# Altium footprint library pcblib.PcbLib: 92 footprints (part 3 of 6)
Each footprint in its own frame and in the unit in brackets; x right, y up, seen from the top. Pads: shape width x height; smd on the part's side, far side on the other; paste and mask are expansions set on the pad; w line width, h text height; cw(c..) or ccw(c..) is an arc to the next point about the centre after c.
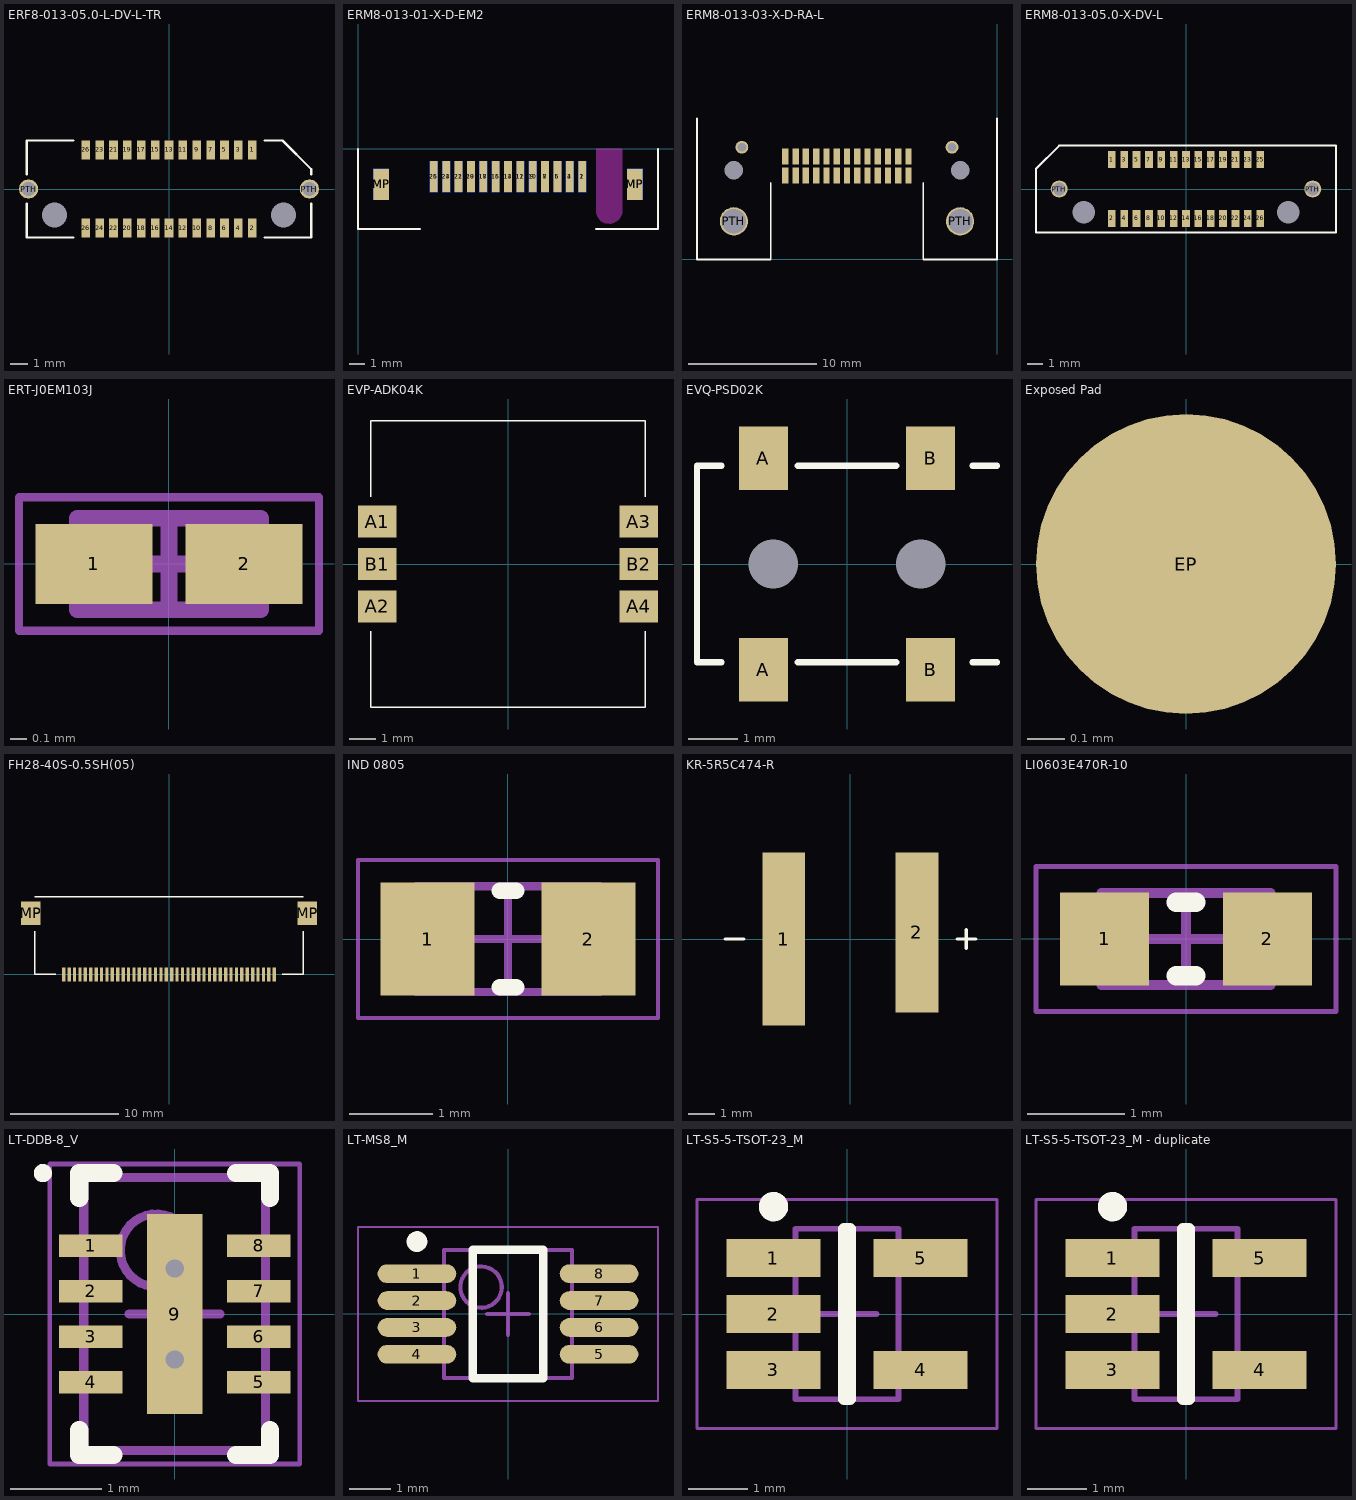
[diagram p2: the footprints below, top view; thin cyan lines are the x and y axes]

## ERF8-013-05.0-L-DV-L-TR [mm] "0,80 mm Edge Rate® Rugged High Speed Socket Strip"
pads (30):
  rect 0.5x1.1 smd: 1(4.8,2.25) 2(4.8,-2.25) 3(4,2.25) 4(4,-2.25) 5(3.2,2.25) 6(3.2,-2.25) 7(2.4,2.25) 8(2.4,-2.25) 9(1.6,2.25) 10(1.6,-2.25) 11(0.8,2.25) 12(0.8,-2.25) 13(0,2.25) 14(0,-2.25) 15(-0.8,2.25) 16(-0.8,-2.25) 17(-1.6,2.25) 18(-1.6,-2.25) 19(-2.4,2.25) 20(-2.4,-2.25) 21(-3.2,2.25) 22(-3.2,-2.25) 23(-4,2.25) 24(-4,-2.25) 26(-4.8,-2.25) 26(-4.8,2.25)
  round 0 hole 1.45 unplated: NPTH(-6.6,-1.5) NPTH(6.6,-1.5)
  round 1.1 hole 0.83: PTH(-8.1,0) PTH(8.1,0)
Top Overlay:
  lines w0.127: -8.2,-0.85 -8.2,-2.8 -5.5,-2.8 ; -8.2,0.85 -8.2,2.8 -5.5,2.8 ; 5.5,-2.8 8.2,-2.8 8.2,-0.85 ; 5.5,2.8 6.547,2.8 8.2,1.147 8.2,0.85
3D body: height 5.35, standoff -1.02, extent -8.2,-2.8 8.2,2.8

## ERM8-013-01-X-D-EM2 [mm] "0,80 mm Edge Rate® Rugged High Speed Terminal Strip, Edge Mount"
pads (30):
  rect 0.5x2 smd: 1(14.5,-1.8) 3(13.7,-1.8) 5(12.9,-1.8) 7(12.1,-1.8) 9(11.3,-1.8) 11(10.5,-1.8) 13(9.7,-1.8) 15(8.9,-1.8) 17(8.1,-1.8) 19(7.3,-1.8) 21(6.5,-1.8) 23(5.7,-1.8) 25(4.9,-1.8)
  rect 0.5x2 smd far side: 2(14.5,-1.8) 4(13.7,-1.8) 6(12.9,-1.8) 8(12.1,-1.8) 10(11.3,-1.8) 12(10.5,-1.8) 14(9.7,-1.8) 16(8.9,-1.8) 18(8.1,-1.8) 20(7.3,-1.8) 22(6.5,-1.8) 24(5.7,-1.8) 26(4.9,-1.8)
  rect 1x2 smd: MP(1.5,-2.3) MP(17.9,-2.3)
  rect 1x2 smd far side: MP(1.5,-2.3) MP(17.9,-2.3)
Top Overlay:
  lines w0.127: 0,0 0,-5.2 4,-5.2 ; 15.4,-5.2 19.4,-5.2 19.4,0
Keep-Out Layer:
  board cut-out: 15.4,0 15.4,-4.088 15.451,-4.291 15.502,-4.393 15.603,-4.545 15.705,-4.672 15.832,-4.748 15.959,-4.799 16.086,-4.825 16.238,-4.85 16.338,-4.85 16.492,-4.799 16.619,-4.748 16.746,-4.672 16.848,-4.596 16.949,-4.469 17.026,-4.342 17.076,-4.215 17.1,-4.088 17.1,0
3D body: height 2.8, standoff -2.8, extent 0,-5.2 19.4,7.75

## ERM8-013-03-X-D-RA-L [mm] "0,80 mm Edge Rate® Rugged High Speed Terminal Strip, Right Angle"
pads (32):
  rect 0.5x1.25 smd: 1(-16.505,8.038) 2(-16.505,6.538) 3(-15.705,8.038) 4(-15.705,6.538) 5(-14.905,8.038) 6(-14.905,6.538) 7(-14.105,8.038) 8(-14.105,6.538) 9(-13.305,8.038) 10(-13.305,6.538) 11(-12.505,8.038) 12(-12.505,6.538) 13(-11.705,8.038) 14(-11.705,6.538) 15(-10.905,8.038) 16(-10.905,6.538) 17(-10.105,8.038) 18(-10.105,6.538) 19(-9.305,8.038) 20(-9.305,6.538) 21(-8.505,8.038) 22(-8.505,6.538) 23(-7.705,8.038) 24(-7.705,6.538) 25(-6.905,8.038) 26(-6.905,6.538)
  round 0 hole 1.45 unplated: NPTH(-20.53,6.978) NPTH(-2.88,6.978)
  round 2.2 hole 1.91: PTH(-20.53,2.978) PTH(-2.88,2.978)
  round 1 hole 0.7: PTH(-19.905,8.758) PTH(-3.505,8.758)
Top Overlay:
  lines w0.127: -23.405,11 -23.405,0 -17.655,0 -17.655,5.98 ; -5.75,5.98 -5.75,0 0,0 0,11
3D body: height 6.35, standoff -2.36, extent -23.405,0 -0.005,15.36

## ERM8-013-05.0-X-DV-L [mm] "0,80 mm Edge Rate® Rugged High Speed Terminal Strip"
pads (30):
  rect 0.5x1.1 smd: 1(-4.8,1.9) 2(-4.8,-1.9) 3(-4,1.9) 4(-4,-1.9) 5(-3.2,1.9) 6(-3.2,-1.9) 7(-2.4,1.9) 8(-2.4,-1.9) 9(-1.6,1.9) 10(-1.6,-1.9) 11(-0.8,1.9) 12(-0.8,-1.9) 13(0,1.9) 14(0,-1.9) 15(0.8,1.9) 16(0.8,-1.9) 17(1.6,1.9) 18(1.6,-1.9) 19(2.4,1.9) 20(2.4,-1.9) 21(3.2,1.9) 22(3.2,-1.9) 23(4,1.9) 24(4,-1.9) 25(4.8,1.9) 26(4.8,-1.9)
  round 0 hole 1.45 unplated: NPTH(-6.6,-1.5) NPTH(6.6,-1.5)
  round 1.1 hole 0.83: PTH(-8.2,0) PTH(8.2,0)
Top Overlay:
  lines w0.127: -9.7,-2.8 9.7,-2.8 9.7,2.8 -8.198,2.8 -9.7,1.298 -9.7,-2.8
3D body: height 8.78, standoff -1.08, extent -9.7,-2.8 9.7,2.8

## ERT-J0EM103J [mm] "THERMISTOR NTC 10K OHM 5% 0402"
height 0.55
pads (2):
  rect 0.7x0.48 smd: 1(-0.45,0) 2(0.45,0)
Mechanical 13:
  lines w0.1: -0.55,-0.275 -0.55,0.275 0.55,0.275 0.55,-0.275 -0.55,-0.275
Mechanical 15:
  lines w0.05: -0.9,-0.4 -0.9,0.4 0.9,0.4 0.9,-0.4 -0.9,-0.4
  lines w0.1: -0.275,0 0.275,0 ; 0,-0.275 0,0.275
3D body: height 0.55, standoff 0, extent -0.3,-0.275 0.3,0.275
3D body: height 0.55, standoff 0, extent -0.55,-0.275 -0.3,0.275
3D body: height 0.55, standoff 0, extent 0.3,-0.275 0.55,0.275

## EVP-ADK04K [mm] "SWITCH TACTILE SPST-NO 0.05A 12V"
height 4.7
pads (6):
  rect 1.45x1.2 smd: A1(-4.925,1.6) A2(-4.925,-1.6) A3(4.925,1.6) A4(4.925,-1.6) B1(-4.925,0) B2(4.925,0)
Top Overlay:
  lines w0.051: -5.175,2.525 -5.175,5.4 5.175,5.4 5.175,2.525 ; -5.175,-2.525 -5.175,-5.4 5.175,-5.4 5.175,-2.525
3D body: height 4.7, standoff 0, extent -5.175,-5.4 5.175,5.4

## EVQ-PSD02K [mm] "SWITCH TACTILE SPST-NO 0.05A 12V"
pads (6):
  rect 1x1.3 smd: A(-1.7,-2.15) A(-1.7,2.15) B(1.7,-2.15) B(1.7,2.15)
  round 0 hole 1 unplated: MH(-1.5,0) MH(1.5,0)
Top Overlay:
  lines w0.127: -2.55,-2 -3.05,-2 -3.05,2 -2.55,2 ; -1,-2 1,-2 ; -1,2 1,2 ; 2.55,-2 3.05,-2 ; 2.55,2 3.05,2
3D body: height 1.85, standoff -0.5, extent -3,-2.323 4.45,2.323

## Exposed Pad [mm] "Exposed Pad for shorting/event button on PCB"
pads (1):
  round 0.8 smd: EP(0,0)

## FH28-40S-0.5SH(05) [mm] "CONN FPC 40POS 0.5MM SMD GOLD"
height 2.55
pads (42):
  rect 0.3x1.3 smd: 1(9.75,0) 2(9.25,0) 3(8.75,0) 4(8.25,0) 5(7.75,0) 6(7.25,0) 7(6.75,0) 8(6.25,0) 9(5.75,0) 10(5.25,0) 11(4.75,0) 12(4.25,0) 13(3.75,0) 14(3.25,0) 15(2.75,0) 16(2.25,0) 17(1.75,0) 18(1.25,0) 19(0.75,0) 20(0.25,0) 21(-0.25,0) 22(-0.75,0) 23(-1.25,0) 24(-1.75,0) 25(-2.25,0) 26(-2.75,0) 27(-3.25,0) 28(-3.75,0) 29(-4.25,0) 30(-4.75,0) 31(-5.25,0) 32(-5.75,0) 33(-6.25,0) 34(-6.75,0) 35(-7.25,0) 36(-7.75,0) 37(-8.25,0) 38(-8.75,0) 39(-9.25,0) 40(-9.75,0)
  rect 1.8x2.2 smd: MP(-12.8,5.65) MP(12.8,5.65)
Top Overlay:
  lines w0.127: -12.45,4 -12.45,0 -10.5,0 ; -12.45,7.2 12.45,7.2 ; 10.5,0 12.45,0 12.45,4
3D body: height 2.5, standoff -0.05, extent -12.45,0 12.45,7.2

## IND 0805 [mm] "Chip Inductor, 2-Leads, Body 2.00x1.25mm, IPC Medium Density"
height 1.1
pads (2):
  rect 1.13x1.36 smd: 1(-0.965,0) 2(0.965,0)
Top Overlay:
  lines w0.2: -0.1,-0.58 0.1,-0.58 ; -0.1,0.58 0.1,0.58
Mechanical 13:
  lines w0.1: -1.1,-0.635 -1.1,0.635 1.1,0.635 1.1,-0.635 -1.1,-0.635
Mechanical 15:
  lines w0.05: -1.8,-0.95 -1.8,0.95 1.8,0.95 1.8,-0.95 -1.8,-0.95
  lines w0.1: -0.5,0 0.5,0 ; 0,-0.5 0,0.5
3D body: height 1.1, standoff 0, extent -0.6,-0.635 0.6,0.635
3D body: height 1.1, standoff 0, extent -1.1,-0.635 -0.6,0.635
3D body: height 1.1, standoff 0, extent 0.6,-0.635 1.1,0.635

## KR-5R5C474-R [mm] "CAP SUPER 0.47F 5.5V RADIAL"
pads (2):
  rect 1.6x6.5 smd: 1(-2.5,0)
  rect 1.6x6 smd: 2(2.5,0.25)
Top Overlay:
  lines w0.127: -4.7,0 -4,0 ; 4,0 4.7,0 ; 4.35,-0.35 4.35,0.35
3D body: height 6.74, standoff -6.74, extent -6.723,3.5 6.723,9.9

## LI0603E470R-10 [mm] "FERRITE CHIP 47 OHMS 500MA 0603"
height 0.8
pads (2):
  rect 0.92x0.96 smd: 1(-0.84,0) 2(0.84,0)
Top Overlay:
  lines w0.2: -0.1,-0.38 0.1,-0.38 ; -0.1,0.38 0.1,0.38
Mechanical 13:
  lines w0.1: -0.875,-0.475 0.875,-0.475 0.875,0.475 -0.875,0.475 -0.875,-0.475
Mechanical 15:
  lines w0.05: -1.55,-0.75 1.55,-0.75 1.55,0.75 -1.55,0.75 -1.55,-0.75
  lines w0.1: -0.475,0 0.475,0 ; 0,-0.475 0,0.475
3D body: height 0.95, standoff 0, extent 0.515,-0.475 0.875,0.475
3D body: height 0.95, standoff 0, extent -0.875,-0.475 -0.515,0.475
3D body: height 0.95, standoff 0, extent -0.515,-0.475 0.515,0.475

## LT-DDB-8_V [mm] "SON, 8-Leads, Body 3x2mm, Pitch 0.5mm, Thermal Pad 2.2x0.61mm"
height 0.8
pads (9):
  rect 0.7x0.25 smd mask+0.102: 1(-0.925,0.75) 2(-0.925,0.25) 3(-0.925,-0.25) 4(-0.925,-0.75) 5(0.925,-0.75) 6(0.925,-0.25) 7(0.925,0.25) 8(0.925,0.75)
  rect 0.61x2.2 smd mask+0.102: 9(0,0)
via 0,0.5 diameter 0.5 hole 0.2
via 0,-0.5 diameter 0.5 hole 0.2
Top Overlay:
  circle w0.1: c-1.45,1.55 r0.05
  lines w0.2: -1.05,-1.275 -1.05,-1.55 -0.675,-1.55 ; -1.05,1.275 -1.05,1.55 -0.675,1.55 ; 0.675,-1.55 1.05,-1.55 1.05,-1.275 ; 0.675,1.55 1.05,1.55 1.05,1.275
Mechanical 13:
  circle w0.1: c-0.2,0.7 r0.4
  lines w0.1: -1,-1.5 -1,1.5 1,1.5 1,-1.5 -1,-1.5
Mechanical 15:
  lines w0.05: -1.375,-1.65 -1.375,1.65 1.375,1.65 1.375,-1.65 -1.375,-1.65
  lines w0.1: -0.5,0 0.5,0 ; 0,-0.5 0,0.5
3D body: height 0.8, standoff 0, extent -1,-1.5 1,1.5

## LT-MS8_M [mm] "SOP, 8-Leads, Body 3x3mm, Pitch 0.65mm, IPC Low Density"
height 1.1
pads (8):
  oval 1.9x0.45 smd: 1(-2.2,0.975) 2(-2.2,0.325) 3(-2.2,-0.325) 4(-2.2,-0.975) 5(2.2,-0.975) 6(2.2,-0.325) 7(2.2,0.325) 8(2.2,0.975)
Top Overlay:
  circle w0.25: c-2.2,1.75 r0.125
  lines w0.2: -0.85,-1.55 0.85,-1.55 0.85,1.55 -0.85,1.55 -0.85,-1.55
Mechanical 13:
  circle w0.1: c-0.65,0.65 r0.5
  lines w0.1: -1.55,-1.55 1.55,-1.55 1.55,1.55 -1.55,1.55 -1.55,-1.55
Mechanical 15:
  lines w0.05: -3.625,-2.1 3.625,-2.1 3.625,2.1 -3.625,2.1 -3.625,-2.1
  lines w0.1: -0.5,0 0.5,0 ; 0,-0.5 0,0.5
3D body: height 1.1, standoff 0.05, extent -1.55,-1.55 1.55,1.55

## LT-S5-5-TSOT-23_M [mm] "SOT23, 5-Leads, Body 2.90x1.63mm, Pitch 0.95mm, IPC Low Density"
height 1
pads (5):
  rect 1.6x0.65 smd: 1(-1.25,0.95) 2(-1.25,0) 3(-1.25,-0.95) 4(1.25,-0.95) 5(1.25,0.95)
Top Overlay:
  circle w0.25: c-1.25,1.825 r0.125
  lines w0.2: -0.05,-1.45 -0.05,1.45 0.05,1.45 0.05,-1.45 -0.05,-1.45
Mechanical 13:
  lines w0.1: -0.875,-1.45 0.875,-1.45 0.875,1.45 -0.875,1.45 -0.875,-1.45
Mechanical 15:
  lines w0.05: -2.55,-1.95 2.55,-1.95 2.55,1.95 -2.55,1.95 -2.55,-1.95
  lines w0.1: -0.5,0 0.5,0 ; 0,-0.5 0,0.5
3D body: height 1, standoff 0.01, extent -0.875,-1.45 0.875,1.45

## LT-S5-5-TSOT-23_M - duplicate [mm] "SOT23, 5-Leads, Body 2.90x1.63mm, Pitch 0.95mm, IPC Low Density"
height 1
pads (5):
  rect 1.6x0.65 smd: 1(-1.25,0.95) 2(-1.25,0) 3(-1.25,-0.95) 4(1.25,-0.95) 5(1.25,0.95)
Top Overlay:
  circle w0.25: c-1.25,1.825 r0.125
  lines w0.2: -0.05,-1.45 0.05,-1.45 0.05,1.45 -0.05,1.45 -0.05,-1.45
Mechanical 13:
  lines w0.1: -0.875,-1.45 -0.875,1.45 0.875,1.45 0.875,-1.45 -0.875,-1.45
Mechanical 15:
  lines w0.05: -2.55,-1.95 -2.55,1.95 2.55,1.95 2.55,-1.95 -2.55,-1.95
  lines w0.1: -0.5,0 0.5,0 ; 0,-0.5 0,0.5
3D body: height 1, standoff 0.01, extent -0.875,-1.45 0.875,1.45